# Altium footprint library IC.PcbLib: 386 footprints (part 3 of 30)
Each footprint in its own frame and in the unit in brackets; x right, y up, seen from the top. Pads: shape width x height; smd on the part's side, far side on the other; paste and mask are expansions set on the pad; w line width, h text height; cw(c..) or ccw(c..) is an arc to the next point about the centre after c.
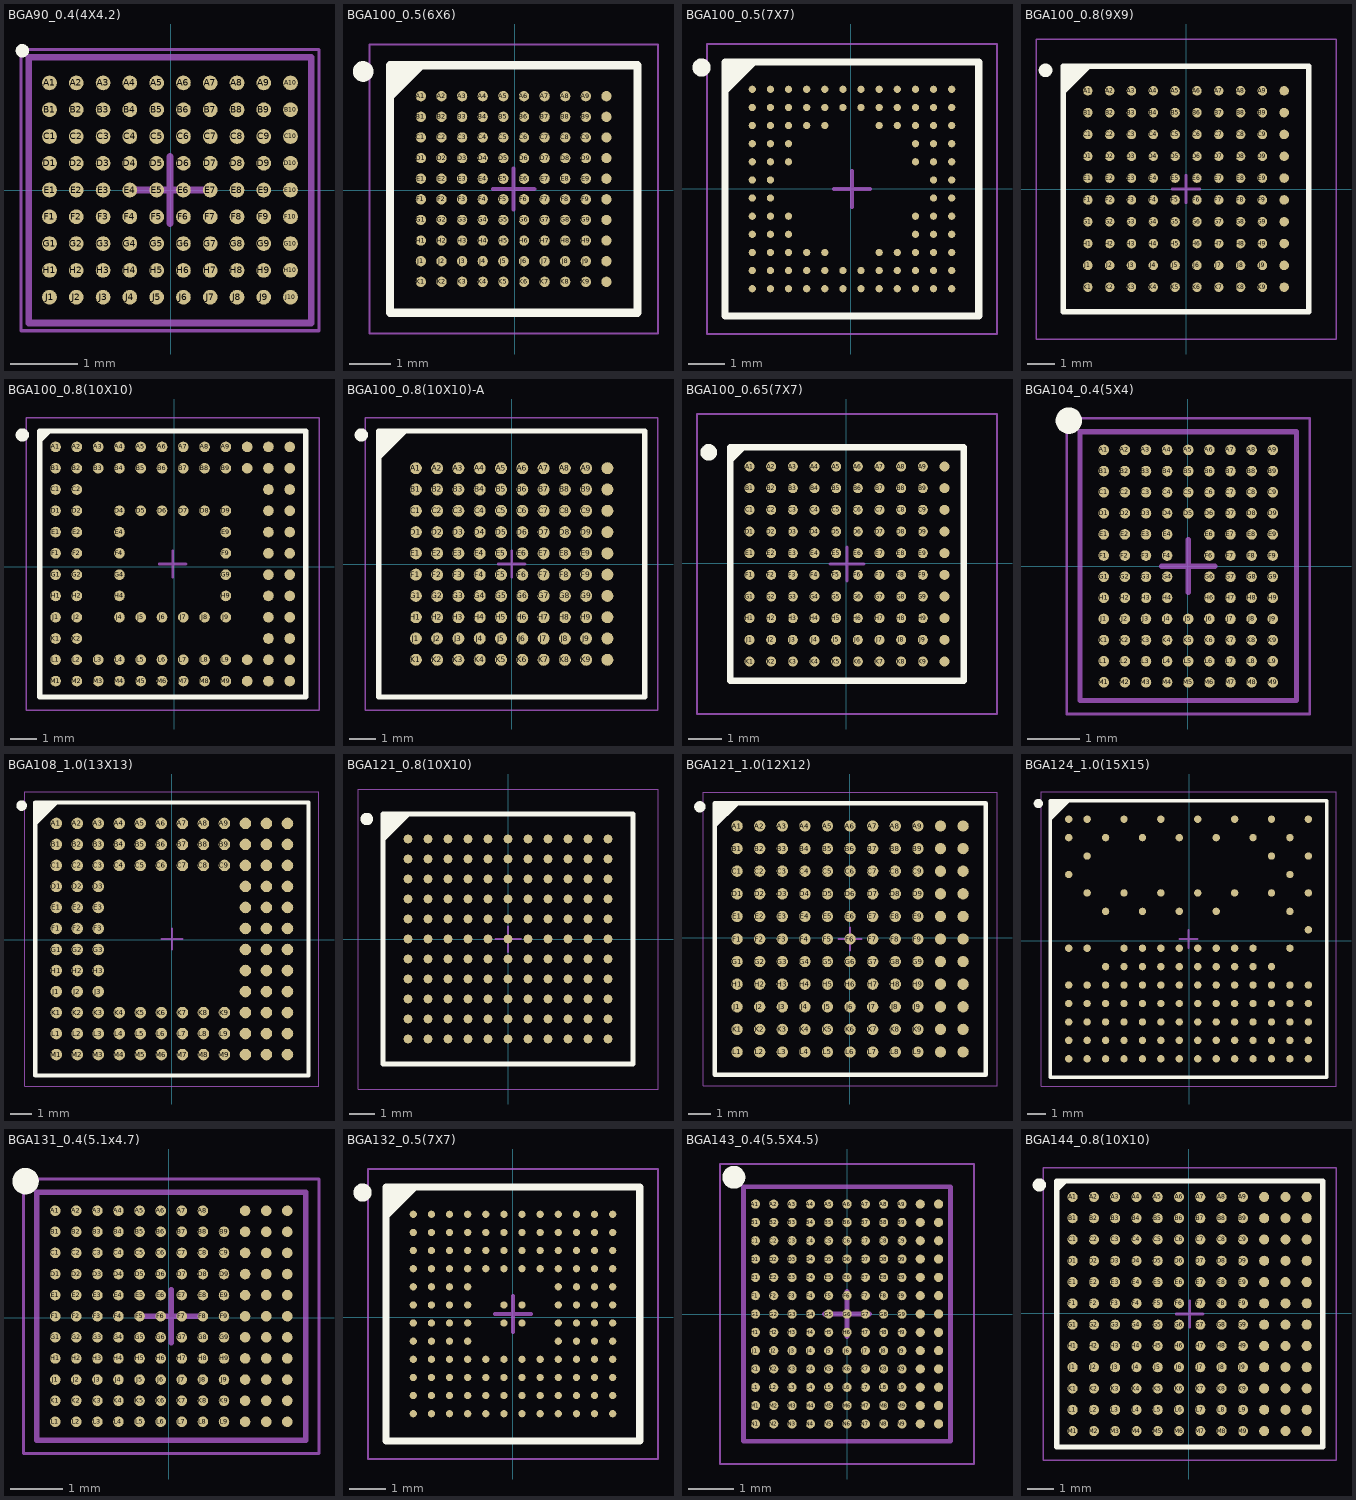
[diagram p2: the footprints below, top view; thin cyan lines are the x and y axes]

## BGA90_0.4(4X4.2) [mm]
pads (90):
  round 0.22 smd: A1(-1.813,1.6) A2(-1.413,1.6) A3(-1.013,1.6) A4(-0.613,1.6) A5(-0.213,1.6) A6(0.187,1.6) A7(0.587,1.6) A8(0.987,1.6) A9(1.387,1.6) A10(1.787,1.6) B1(-1.813,1.2) B2(-1.413,1.2) B3(-1.013,1.2) B4(-0.613,1.2) B5(-0.213,1.2) B6(0.187,1.2) B7(0.587,1.2) B8(0.987,1.2) B9(1.387,1.2) B10(1.787,1.2) C1(-1.813,0.8) C2(-1.413,0.8) C3(-1.013,0.8) C4(-0.613,0.8) C5(-0.213,0.8) C6(0.187,0.8) C7(0.587,0.8) C8(0.987,0.8) C9(1.387,0.8) C10(1.787,0.8) D1(-1.813,0.4) D2(-1.413,0.4) D3(-1.013,0.4) D4(-0.613,0.4) D5(-0.213,0.4) D6(0.187,0.4) D7(0.587,0.4) D8(0.987,0.4) D9(1.387,0.4) D10(1.787,0.4) E1(-1.813,0) E2(-1.413,0) E3(-1.013,0) E4(-0.613,0) E5(-0.213,0) E6(0.187,0) E7(0.587,0) E8(0.987,0) E9(1.387,0) E10(1.787,0) F1(-1.813,-0.4) F2(-1.413,-0.4) F3(-1.013,-0.4) F4(-0.613,-0.4) F5(-0.213,-0.4) F6(0.187,-0.4) F7(0.587,-0.4) F8(0.987,-0.4) F9(1.387,-0.4) F10(1.787,-0.4) G1(-1.813,-0.8) G2(-1.413,-0.8) G3(-1.013,-0.8) G4(-0.613,-0.8) G5(-0.213,-0.8) G6(0.187,-0.8) G7(0.587,-0.8) G8(0.987,-0.8) G9(1.387,-0.8) G10(1.787,-0.8) H1(-1.813,-1.2) H2(-1.413,-1.2) H3(-1.013,-1.2) H4(-0.613,-1.2) H5(-0.213,-1.2) H6(0.187,-1.2) H7(0.587,-1.2) H8(0.987,-1.2) H9(1.387,-1.2) H10(1.787,-1.2) J1(-1.813,-1.6) J2(-1.413,-1.6) J3(-1.013,-1.6) J4(-0.613,-1.6) J5(-0.213,-1.6) J6(0.187,-1.6) J7(0.587,-1.6) J8(0.987,-1.6) J9(1.387,-1.6) J10(1.787,-1.6)
Top Overlay:
  circle w0.1: c-2.219,2.081 r0.05
Mechanical 13:
  lines w0.1: -2.123,-1.985 -2.123,1.985 2.097,1.985 2.097,-1.985 -2.123,-1.985
Mechanical 15:
  lines w0.05: -2.238,-2.1 2.212,-2.1 2.212,2.1 -2.238,2.1 -2.238,-2.1
  lines w0.1: -0.513,0 0.487,0 ; -0.013,-0.5 -0.013,0.5
3D body "BGA90C40P10X9_420X400X65.step": height 0.65, standoff 0, extent -2.1,-2 2.1,2

## BGA100_0.5(6X6) [mm]
height 0.254
pads (100):
  round 0.25 smd: A1(-2.275,2.275) A2(-1.775,2.275) A3(-1.275,2.275) A4(-0.775,2.275) A5(-0.275,2.275) A6(0.225,2.275) A7(0.725,2.275) A8(1.225,2.275) A9(1.725,2.275) A10(2.225,2.275) B1(-2.275,1.775) B2(-1.775,1.775) B3(-1.275,1.775) B4(-0.775,1.775) B5(-0.275,1.775) B6(0.225,1.775) B7(0.725,1.775) B8(1.225,1.775) B9(1.725,1.775) B10(2.225,1.775) C1(-2.275,1.275) C2(-1.775,1.275) C3(-1.275,1.275) C4(-0.775,1.275) C5(-0.275,1.275) C6(0.225,1.275) C7(0.725,1.275) C8(1.225,1.275) C9(1.725,1.275) C10(2.225,1.275) D1(-2.275,0.775) D2(-1.775,0.775) D3(-1.275,0.775) D4(-0.775,0.775) D5(-0.275,0.775) D6(0.225,0.775) D7(0.725,0.775) D8(1.225,0.775) D9(1.725,0.775) D10(2.225,0.775) E1(-2.275,0.275) E2(-1.775,0.275) E3(-1.275,0.275) E4(-0.775,0.275) E5(-0.275,0.275) E6(0.225,0.275) E7(0.725,0.275) E8(1.225,0.275) E9(1.725,0.275) E10(2.225,0.275) F1(-2.275,-0.225) F2(-1.775,-0.225) F3(-1.275,-0.225) F4(-0.775,-0.225) F5(-0.275,-0.225) F6(0.225,-0.225) F7(0.725,-0.225) F8(1.225,-0.225) F9(1.725,-0.225) F10(2.225,-0.225) G1(-2.275,-0.725) G2(-1.775,-0.725) G3(-1.275,-0.725) G4(-0.775,-0.725) G5(-0.275,-0.725) G6(0.225,-0.725) G7(0.725,-0.725) G8(1.225,-0.725) G9(1.725,-0.725) G10(2.225,-0.725) H1(-2.275,-1.225) H2(-1.775,-1.225) H3(-1.275,-1.225) H4(-0.775,-1.225) H5(-0.275,-1.225) H6(0.225,-1.225) H7(0.725,-1.225) H8(1.225,-1.225) H9(1.725,-1.225) H10(2.225,-1.225) J1(-2.275,-1.725) J2(-1.775,-1.725) J3(-1.275,-1.725) J4(-0.775,-1.725) J5(-0.275,-1.725) J6(0.225,-1.725) J7(0.725,-1.725) J8(1.225,-1.725) J9(1.725,-1.725) J10(2.225,-1.725) K1(-2.275,-2.225) K2(-1.775,-2.225) K3(-1.275,-2.225) K4(-0.775,-2.225) K5(-0.275,-2.225) K6(0.225,-2.225) K7(0.725,-2.225) K8(1.225,-2.225) K9(1.725,-2.225) K10(2.225,-2.225)
Top Overlay:
  circle w0.25: c-3.675,2.875 r0.125
  region: -2.268,3.025 -3.025,2.268 -3.025,3.025
  lines w0.2: -3.025,2.268 -2.268,3.025 ; -3.025,-2.975 -3.025,3.025 2.975,3.025 2.975,-2.975 -3.025,-2.975
Mechanical 13:
  lines w0.1: -3.025,-2.975 -3.025,3.025 2.975,3.025 2.975,-2.975 -3.025,-2.975
Mechanical 15:
  lines w0.05: -3.525,-3.475 -3.525,3.525 3.475,3.525 3.475,-3.475 -3.525,-3.475
  lines w0.1: -0.525,0.025 0.475,0.025 ; -0.025,-0.475 -0.025,0.525
3D body "BGA100C50P10X10_600X600X65.step": height 0.65, standoff 0, extent -3.025,-2.949 2.975,3.051

## BGA100_0.5(7X7) [mm]
pads (100):
  round 0.2 smd: A1(-2.712,2.737) A2(-2.212,2.737) A3(-1.712,2.737) A4(-1.212,2.737) A5(-0.712,2.737) A6(-0.212,2.737) A7(0.288,2.737) A8(0.788,2.737) A9(1.288,2.737) A10(1.788,2.737) A11(2.288,2.737) A12(2.788,2.737) B1(-2.712,2.237) B2(-2.212,2.237) B3(-1.712,2.237) B4(-1.212,2.237) B5(-0.712,2.237) B6(-0.212,2.237) B7(0.288,2.237) B8(0.788,2.237) B9(1.288,2.237) B10(1.788,2.237) B11(2.288,2.237) B12(2.788,2.237) C1(-2.712,1.737) C2(-2.212,1.737) C3(-1.712,1.737) C4(-1.212,1.737) C5(-0.712,1.737) C8(0.788,1.737) C9(1.288,1.737) C10(1.788,1.737) C11(2.288,1.737) C12(2.788,1.737) D1(-2.712,1.237) D2(-2.212,1.237) D3(-1.712,1.237) D10(1.788,1.237) D11(2.288,1.237) D12(2.788,1.237) E1(-2.712,0.737) E2(-2.212,0.737) E3(-1.712,0.737) E10(1.788,0.737) E11(2.288,0.737) E12(2.788,0.737) F1(-2.712,0.237) F2(-2.212,0.237) F11(2.288,0.237) F12(2.788,0.237) G1(-2.712,-0.263) G2(-2.212,-0.263) G11(2.288,-0.263) G12(2.788,-0.263) H1(-2.712,-0.763) H2(-2.212,-0.763) H3(-1.712,-0.763) H10(1.788,-0.763) H11(2.288,-0.763) H12(2.788,-0.763) J1(-2.712,-1.263) J2(-2.212,-1.263) J3(-1.712,-1.263) J10(1.788,-1.263) J11(2.288,-1.263) J12(2.788,-1.263) K1(-2.712,-1.763) K2(-2.212,-1.763) K3(-1.712,-1.763) K4(-1.212,-1.763) K5(-0.712,-1.763) K8(0.788,-1.763) K9(1.288,-1.763) K10(1.788,-1.763) K11(2.288,-1.763) K12(2.788,-1.763) L1(-2.712,-2.263) L2(-2.212,-2.263) L3(-1.712,-2.263) L4(-1.212,-2.263) L5(-0.712,-2.263) L6(-0.212,-2.263) L7(0.288,-2.263) L8(0.788,-2.263) L9(1.288,-2.263) L10(1.788,-2.263) L11(2.288,-2.263) L12(2.788,-2.263) M1(-2.712,-2.763) M2(-2.212,-2.763) M3(-1.712,-2.763) M4(-1.212,-2.763) M5(-0.712,-2.763) M6(-0.212,-2.763) M7(0.288,-2.763) M8(0.788,-2.763) M9(1.288,-2.763) M10(1.788,-2.763) M11(2.288,-2.763) M12(2.788,-2.763)
Top Overlay:
  circle w0.25: c-4.112,3.337 r0.125
  region: -2.669,3.487 -3.462,2.694 -3.462,3.487
  lines w0.2: -3.462,2.694 -2.669,3.487 ; -3.462,-3.513 3.538,-3.513 3.538,3.487 -3.462,3.487 -3.462,-3.513
Mechanical 13:
  lines w0.1: -3.462,-3.513 3.538,-3.513 3.538,3.487 -3.462,3.487 -3.462,-3.513
Mechanical 15:
  lines w0.05: -3.962,-4.013 4.038,-4.013 4.038,3.987 -3.962,3.987 -3.962,-4.013
  lines w0.1: -0.462,-0.013 0.538,-0.013 ; 0.038,-0.513 0.038,0.487
3D body: height 0.6, standoff 0.05, extent -3.462,-3.513 3.538,3.487
3D body: height 0.61, standoff 0.18, extent -2.967,2.595 -2.568,2.994

## BGA100_0.8(9X9) [mm] "BGA, 100-Leads, Body 9x9mm, Pitch 0.8mm"
height 1.1
pads (100):
  round 0.35 smd: A1(-3.6,3.6) A2(-2.8,3.6) A3(-2,3.6) A4(-1.2,3.6) A5(-0.4,3.6) A6(0.4,3.6) A7(1.2,3.6) A8(2,3.6) A9(2.8,3.6) A10(3.6,3.6) B1(-3.6,2.8) B2(-2.8,2.8) B3(-2,2.8) B4(-1.2,2.8) B5(-0.4,2.8) B6(0.4,2.8) B7(1.2,2.8) B8(2,2.8) B9(2.8,2.8) B10(3.6,2.8) C1(-3.6,2) C2(-2.8,2) C3(-2,2) C4(-1.2,2) C5(-0.4,2) C6(0.4,2) C7(1.2,2) C8(2,2) C9(2.8,2) C10(3.6,2) D1(-3.6,1.2) D2(-2.8,1.2) D3(-2,1.2) D4(-1.2,1.2) D5(-0.4,1.2) D6(0.4,1.2) D7(1.2,1.2) D8(2,1.2) D9(2.8,1.2) D10(3.6,1.2) E1(-3.6,0.4) E2(-2.8,0.4) E3(-2,0.4) E4(-1.2,0.4) E5(-0.4,0.4) E6(0.4,0.4) E7(1.2,0.4) E8(2,0.4) E9(2.8,0.4) E10(3.6,0.4) F1(-3.6,-0.4) F2(-2.8,-0.4) F3(-2,-0.4) F4(-1.2,-0.4) F5(-0.4,-0.4) F6(0.4,-0.4) F7(1.2,-0.4) F8(2,-0.4) F9(2.8,-0.4) F10(3.6,-0.4) G1(-3.6,-1.2) G2(-2.8,-1.2) G3(-2,-1.2) G4(-1.2,-1.2) G5(-0.4,-1.2) G6(0.4,-1.2) G7(1.2,-1.2) G8(2,-1.2) G9(2.8,-1.2) G10(3.6,-1.2) H1(-3.6,-2) H2(-2.8,-2) H3(-2,-2) H4(-1.2,-2) H5(-0.4,-2) H6(0.4,-2) H7(1.2,-2) H8(2,-2) H9(2.8,-2) H10(3.6,-2) J1(-3.6,-2.8) J2(-2.8,-2.8) J3(-2,-2.8) J4(-1.2,-2.8) J5(-0.4,-2.8) J6(0.4,-2.8) J7(1.2,-2.8) J8(2,-2.8) J9(2.8,-2.8) J10(3.6,-2.8) K1(-3.6,-3.6) K2(-2.8,-3.6) K3(-2,-3.6) K4(-1.2,-3.6) K5(-0.4,-3.6) K6(0.4,-3.6) K7(1.2,-3.6) K8(2,-3.6) K9(2.8,-3.6) K10(3.6,-3.6)
Top Overlay:
  circle w0.25: c-5.15,4.35 r0.125
  region: -3.584,4.5 -4.5,3.584 -4.5,4.5
  lines w0.2: -4.5,3.584 -3.584,4.5 ; -4.5,-4.5 -4.5,4.5 4.5,4.5 4.5,-4.5 -4.5,-4.5
Mechanical 13:
  lines w0.1: -4.5,-4.5 -4.5,4.5 4.5,4.5 4.5,-4.5 -4.5,-4.5
Mechanical 15:
  lines w0.05: -5.5,-5.5 -5.5,5.5 5.5,5.5 5.5,-5.5 -5.5,-5.5
  lines w0.1: -0.5,0 0.5,0 ; 0,-0.5 0,0.5
3D body "User Library-TFBGA100.step": height 1.06, standoff 0, extent -4.5,-4.5 4.5,4.5

## BGA100_0.8(10X10) [mm]
pads (100):
  round 0.4 smd: A1(-4.451,4.502) A2(-3.651,4.502) A3(-2.851,4.502) A4(-2.051,4.502) A5(-1.251,4.502) A6(-0.451,4.502) A7(0.349,4.502) A8(1.149,4.502) A9(1.949,4.502) A10(2.749,4.502) A11(3.549,4.502) A12(4.349,4.502) B1(-4.451,3.702) B2(-3.651,3.702) B3(-2.851,3.702) B4(-2.051,3.702) B5(-1.251,3.702) B6(-0.451,3.702) B7(0.349,3.702) B8(1.149,3.702) B9(1.949,3.702) B10(2.749,3.702) B11(3.549,3.702) B12(4.349,3.702) C1(-4.451,2.902) C2(-3.651,2.902) C11(3.549,2.902) C12(4.349,2.902) D1(-4.451,2.102) D2(-3.651,2.102) D4(-2.051,2.102) D5(-1.251,2.102) D6(-0.451,2.102) D7(0.349,2.102) D8(1.149,2.102) D9(1.949,2.102) D11(3.549,2.102) D12(4.349,2.102) E1(-4.451,1.302) E2(-3.651,1.302) E4(-2.051,1.302) E9(1.949,1.302) E11(3.549,1.302) E12(4.349,1.302) F1(-4.451,0.502) F2(-3.651,0.502) F4(-2.051,0.502) F9(1.949,0.502) F11(3.549,0.502) F12(4.349,0.502) G1(-4.451,-0.298) G2(-3.651,-0.298) G4(-2.051,-0.298) G9(1.949,-0.298) G11(3.549,-0.298) G12(4.349,-0.298) H1(-4.451,-1.098) H2(-3.651,-1.098) H4(-2.051,-1.098) H9(1.949,-1.098) H11(3.549,-1.098) H12(4.349,-1.098) J1(-4.451,-1.898) J2(-3.651,-1.898) J4(-2.051,-1.898) J5(-1.251,-1.898) J6(-0.451,-1.898) J7(0.349,-1.898) J8(1.149,-1.898) J9(1.949,-1.898) J11(3.549,-1.898) J12(4.349,-1.898) K1(-4.451,-2.698) K2(-3.651,-2.698) K11(3.549,-2.698) K12(4.349,-2.698) L1(-4.451,-3.498) L2(-3.651,-3.498) L3(-2.851,-3.498) L4(-2.051,-3.498) L5(-1.251,-3.498) L6(-0.451,-3.498) L7(0.349,-3.498) L8(1.149,-3.498) L9(1.949,-3.498) L10(2.749,-3.498) L11(3.549,-3.498) L12(4.349,-3.498) M1(-4.451,-4.298) M2(-3.651,-4.298) M3(-2.851,-4.298) M4(-2.051,-4.298) M5(-1.251,-4.298) M6(-0.451,-4.298) M7(0.349,-4.298) M8(1.149,-4.298) M9(1.949,-4.298) M10(2.749,-4.298) M11(3.549,-4.298) M12(4.349,-4.298)
Top Overlay:
  circle w0.25: c-5.701,4.952 r0.125
  region: -4.699,5.102 -5.051,4.75 -5.051,5.102
  lines w0.2: -5.051,4.75 -4.699,5.102 ; -5.051,-4.898 -5.051,5.102 4.949,5.102 4.949,-4.898 -5.051,-4.898
Mechanical 13:
  lines w0.1: -5.051,-4.898 -5.051,5.102 4.949,5.102 4.949,-4.898 -5.051,-4.898
Mechanical 15:
  lines w0.05: -5.551,-5.398 -5.551,5.602 5.449,5.602 5.449,-5.398 -5.551,-5.398
  lines w0.1: -0.551,0.102 0.449,0.102 ; -0.051,-0.398 -0.051,0.602
3D body: height 1.4, standoff 0.29, extent -5.051,-4.898 4.949,5.102

## BGA100_0.8(10X10)-A [mm]
pads (100):
  round 0.45 smd: A1(-3.606,3.607) A2(-2.806,3.607) A3(-2.006,3.607) A4(-1.206,3.607) A5(-0.406,3.607) A6(0.394,3.607) A7(1.194,3.607) A8(1.994,3.607) A9(2.794,3.607) A10(3.594,3.607) B1(-3.606,2.807) B2(-2.806,2.807) B3(-2.006,2.807) B4(-1.206,2.807) B5(-0.406,2.807) B6(0.394,2.807) B7(1.194,2.807) B8(1.994,2.807) B9(2.794,2.807) B10(3.594,2.807) C1(-3.606,2.007) C2(-2.806,2.007) C3(-2.006,2.007) C4(-1.206,2.007) C5(-0.406,2.007) C6(0.394,2.007) C7(1.194,2.007) C8(1.994,2.007) C9(2.794,2.007) C10(3.594,2.007) D1(-3.606,1.207) D2(-2.806,1.207) D3(-2.006,1.207) D4(-1.206,1.207) D5(-0.406,1.207) D6(0.394,1.207) D7(1.194,1.207) D8(1.994,1.207) D9(2.794,1.207) D10(3.594,1.207) E1(-3.606,0.407) E2(-2.806,0.407) E3(-2.006,0.407) E4(-1.206,0.407) E5(-0.406,0.407) E6(0.394,0.407) E7(1.194,0.407) E8(1.994,0.407) E9(2.794,0.407) E10(3.594,0.407) F1(-3.606,-0.393) F2(-2.806,-0.393) F3(-2.006,-0.393) F4(-1.206,-0.393) F5(-0.406,-0.393) F6(0.394,-0.393) F7(1.194,-0.393) F8(1.994,-0.393) F9(2.794,-0.393) F10(3.594,-0.393) G1(-3.606,-1.193) G2(-2.806,-1.193) G3(-2.006,-1.193) G4(-1.206,-1.193) G5(-0.406,-1.193) G6(0.394,-1.193) G7(1.194,-1.193) G8(1.994,-1.193) G9(2.794,-1.193) G10(3.594,-1.193) H1(-3.606,-1.993) H2(-2.806,-1.993) H3(-2.006,-1.993) H4(-1.206,-1.993) H5(-0.406,-1.993) H6(0.394,-1.993) H7(1.194,-1.993) H8(1.994,-1.993) H9(2.794,-1.993) H10(3.594,-1.993) J1(-3.606,-2.793) J2(-2.806,-2.793) J3(-2.006,-2.793) J4(-1.206,-2.793) J5(-0.406,-2.793) J6(0.394,-2.793) J7(1.194,-2.793) J8(1.994,-2.793) J9(2.794,-2.793) J10(3.594,-2.793) K1(-3.606,-3.593) K2(-2.806,-3.593) K3(-2.006,-3.593) K4(-1.206,-3.593) K5(-0.406,-3.593) K6(0.394,-3.593) K7(1.194,-3.593) K8(1.994,-3.593) K9(2.794,-3.593) K10(3.594,-3.593)
Top Overlay:
  circle w0.25: c-5.656,4.857 r0.125
  region: -4.006,5.007 -5.006,4.007 -5.006,5.007
  lines w0.2: -5.006,4.007 -4.006,5.007 ; -5.006,-4.993 -5.006,5.007 4.994,5.007 4.994,-4.993 -5.006,-4.993
Mechanical 13:
  lines w0.1: -5.006,-4.993 -5.006,5.007 4.994,5.007 4.994,-4.993 -5.006,-4.993
Mechanical 15:
  lines w0.05: -5.506,-5.493 -5.506,5.507 5.494,5.507 5.494,-5.493 -5.506,-5.493
  lines w0.1: -0.506,0.007 0.494,0.007 ; -0.006,-0.493 -0.006,0.507
3D body "User Library-A3D-009-00025.step": height 2.08, standoff -0.02, extent -4.978,-5 5.022,5

## BGA100_0.65(7X7) [mm]
pads (100):
  round 0.3 smd: A1(-2.9,2.9) A2(-2.25,2.9) A3(-1.6,2.9) A4(-0.95,2.9) A5(-0.3,2.9) A6(0.35,2.9) A7(1,2.9) A8(1.65,2.9) A9(2.3,2.9) A10(2.95,2.9) B1(-2.9,2.25) B2(-2.25,2.25) B3(-1.6,2.25) B4(-0.95,2.25) B5(-0.3,2.25) B6(0.35,2.25) B7(1,2.25) B8(1.65,2.25) B9(2.3,2.25) B10(2.95,2.25) C1(-2.9,1.6) C2(-2.25,1.6) C3(-1.6,1.6) C4(-0.95,1.6) C5(-0.3,1.6) C6(0.35,1.6) C7(1,1.6) C8(1.65,1.6) C9(2.3,1.6) C10(2.95,1.6) D1(-2.9,0.95) D2(-2.25,0.95) D3(-1.6,0.95) D4(-0.95,0.95) D5(-0.3,0.95) D6(0.35,0.95) D7(1,0.95) D8(1.65,0.95) D9(2.3,0.95) D10(2.95,0.95) E1(-2.9,0.3) E2(-2.25,0.3) E3(-1.6,0.3) E4(-0.95,0.3) E5(-0.3,0.3) E6(0.35,0.3) E7(1,0.3) E8(1.65,0.3) E9(2.3,0.3) E10(2.95,0.3) F1(-2.9,-0.35) F2(-2.25,-0.35) F3(-1.6,-0.35) F4(-0.95,-0.35) F5(-0.3,-0.35) F6(0.35,-0.35) F7(1,-0.35) F8(1.65,-0.35) F9(2.3,-0.35) F10(2.95,-0.35) G1(-2.9,-1) G2(-2.25,-1) G3(-1.6,-1) G4(-0.95,-1) G5(-0.3,-1) G6(0.35,-1) G7(1,-1) G8(1.65,-1) G9(2.3,-1) G10(2.95,-1) H1(-2.9,-1.65) H2(-2.25,-1.65) H3(-1.6,-1.65) H4(-0.95,-1.65) H5(-0.3,-1.65) H6(0.35,-1.65) H7(1,-1.65) H8(1.65,-1.65) H9(2.3,-1.65) H10(2.95,-1.65) J1(-2.9,-2.3) J2(-2.25,-2.3) J3(-1.6,-2.3) J4(-0.95,-2.3) J5(-0.3,-2.3) J6(0.35,-2.3) J7(1,-2.3) J8(1.65,-2.3) J9(2.3,-2.3) J10(2.95,-2.3) K1(-2.9,-2.95) K2(-2.25,-2.95) K3(-1.6,-2.95) K4(-0.95,-2.95) K5(-0.3,-2.95) K6(0.35,-2.95) K7(1,-2.95) K8(1.65,-2.95) K9(2.3,-2.95) K10(2.95,-2.95)
Top Overlay:
  circle w0.25: c-4.125,3.325 r0.125
  region: -3.102,3.475 -3.475,3.102 -3.475,3.475
  lines w0.2: -3.475,3.102 -3.102,3.475 ; -3.475,-3.525 3.525,-3.525 3.525,3.475 -3.475,3.475 -3.475,-3.525
Mechanical 13:
  lines w0.1: -3.475,-3.525 3.525,-3.525 3.525,3.475 -3.475,3.475 -3.475,-3.525
Mechanical 15:
  lines w0.05: -4.475,-4.525 4.525,-4.525 4.525,4.475 -4.475,4.475 -4.475,-4.525
  lines w0.1: -0.475,-0.025 0.525,-0.025 ; 0.025,-0.525 0.025,0.475
3D body "BGA100C65P10X10_700X700X100.step": height 1, standoff 0, extent -3.475,-3.5 3.525,3.5

## BGA104_0.4(5X4) [mm]
pads (104):
  round 0.2 smd: A1(-1.587,2.2) A2(-1.187,2.2) A3(-0.787,2.2) A4(-0.387,2.2) A5(0.013,2.2) A6(0.413,2.2) A7(0.813,2.2) A8(1.213,2.2) A9(1.613,2.2) B1(-1.587,1.8) B2(-1.187,1.8) B3(-0.787,1.8) B4(-0.387,1.8) B5(0.013,1.8) B6(0.413,1.8) B7(0.813,1.8) B8(1.213,1.8) B9(1.613,1.8) C1(-1.587,1.4) C2(-1.187,1.4) C3(-0.787,1.4) C4(-0.387,1.4) C5(0.013,1.4) C6(0.413,1.4) C7(0.813,1.4) C8(1.213,1.4) C9(1.613,1.4) D1(-1.587,1) D2(-1.187,1) D3(-0.787,1) D4(-0.387,1) D5(0.013,1) D6(0.413,1) D7(0.813,1) D8(1.213,1) D9(1.613,1) E1(-1.587,0.6) E2(-1.187,0.6) E3(-0.787,0.6) E4(-0.387,0.6) E6(0.413,0.6) E7(0.813,0.6) E8(1.213,0.6) E9(1.613,0.6) F1(-1.587,0.2) F2(-1.187,0.2) F3(-0.787,0.2) F4(-0.387,0.2) F6(0.413,0.2) F7(0.813,0.2) F8(1.213,0.2) F9(1.613,0.2) G1(-1.587,-0.2) G2(-1.187,-0.2) G3(-0.787,-0.2) G4(-0.387,-0.2) G6(0.413,-0.2) G7(0.813,-0.2) G8(1.213,-0.2) G9(1.613,-0.2) H1(-1.587,-0.6) H2(-1.187,-0.6) H3(-0.787,-0.6) H4(-0.387,-0.6) H6(0.413,-0.6) H7(0.813,-0.6) H8(1.213,-0.6) H9(1.613,-0.6) J1(-1.587,-1) J2(-1.187,-1) J3(-0.787,-1) J4(-0.387,-1) J5(0.013,-1) J6(0.413,-1) J7(0.813,-1) J8(1.213,-1) J9(1.613,-1) K1(-1.587,-1.4) K2(-1.187,-1.4) K3(-0.787,-1.4) K4(-0.387,-1.4) K5(0.013,-1.4) K6(0.413,-1.4) K7(0.813,-1.4) K8(1.213,-1.4) K9(1.613,-1.4) L1(-1.587,-1.8) L2(-1.187,-1.8) L3(-0.787,-1.8) L4(-0.387,-1.8) L5(0.013,-1.8) L6(0.413,-1.8) L7(0.813,-1.8) L8(1.213,-1.8) L9(1.613,-1.8) M1(-1.587,-2.2) M2(-1.187,-2.2) M3(-0.787,-2.2) M4(-0.387,-2.2) M5(0.013,-2.2) M6(0.413,-2.2) M7(0.813,-2.2) M8(1.213,-2.2) M9(1.613,-2.2)
Top Overlay:
  circle w0.25: c-2.247,2.755 r0.125
Mechanical 13:
  lines w0.1: -2.037,-2.545 -2.037,2.545 2.063,2.545 2.063,-2.545 -2.037,-2.545
Mechanical 15:
  lines w0.05: -2.287,-2.8 -2.287,2.8 2.313,2.8 2.313,-2.8 -2.287,-2.8
  lines w0.1: -0.487,0 0.513,0 ; 0.013,-0.5 0.013,0.5
3D body "User Library-WLCSP104.step": height 0.56, standoff 0, extent -2.065,-2.564 2.065,2.564

## BGA108_1.0(13X13) [mm]
pads (108):
  round 0.55 smd: A1(-5.5,5.525) A2(-4.5,5.525) A3(-3.5,5.525) A4(-2.5,5.525) A5(-1.5,5.525) A6(-0.5,5.525) A7(0.5,5.525) A8(1.5,5.525) A9(2.5,5.525) A10(3.5,5.525) A11(4.5,5.525) A12(5.5,5.525) B1(-5.5,4.525) B2(-4.5,4.525) B3(-3.5,4.525) B4(-2.5,4.525) B5(-1.5,4.525) B6(-0.5,4.525) B7(0.5,4.525) B8(1.5,4.525) B9(2.5,4.525) B10(3.5,4.525) B11(4.5,4.525) B12(5.5,4.525) C1(-5.5,3.525) C2(-4.5,3.525) C3(-3.5,3.525) C4(-2.5,3.525) C5(-1.5,3.525) C6(-0.5,3.525) C7(0.5,3.525) C8(1.5,3.525) C9(2.5,3.525) C10(3.5,3.525) C11(4.5,3.525) C12(5.5,3.525) D1(-5.5,2.525) D2(-4.5,2.525) D3(-3.5,2.525) D10(3.5,2.525) D11(4.5,2.525) D12(5.5,2.525) E1(-5.5,1.525) E2(-4.5,1.525) E3(-3.5,1.525) E10(3.5,1.525) E11(4.5,1.525) E12(5.5,1.525) F1(-5.5,0.525) F2(-4.5,0.525) F3(-3.5,0.525) F10(3.5,0.525) F11(4.5,0.525) F12(5.5,0.525) G1(-5.5,-0.475) G2(-4.5,-0.475) G3(-3.5,-0.475) G10(3.5,-0.475) G11(4.5,-0.475) G12(5.5,-0.475) H1(-5.5,-1.475) H2(-4.5,-1.475) H3(-3.5,-1.475) H10(3.5,-1.475) H11(4.5,-1.475) H12(5.5,-1.475) J1(-5.5,-2.475) J2(-4.5,-2.475) J3(-3.5,-2.475) J10(3.5,-2.475) J11(4.5,-2.475) J12(5.5,-2.475) K1(-5.5,-3.475) K2(-4.5,-3.475) K3(-3.5,-3.475) K4(-2.5,-3.475) K5(-1.5,-3.475) K6(-0.5,-3.475) K7(0.5,-3.475) K8(1.5,-3.475) K9(2.5,-3.475) K10(3.5,-3.475) K11(4.5,-3.475) K12(5.5,-3.475) L1(-5.5,-4.475) L2(-4.5,-4.475) L3(-3.5,-4.475) L4(-2.5,-4.475) L5(-1.5,-4.475) L6(-0.5,-4.475) L7(0.5,-4.475) L8(1.5,-4.475) L9(2.5,-4.475) L10(3.5,-4.475) L11(4.5,-4.475) L12(5.5,-4.475) M1(-5.5,-5.475) M2(-4.5,-5.475) M3(-3.5,-5.475) M4(-2.5,-5.475) M5(-1.5,-5.475) M6(-0.5,-5.475) M7(0.5,-5.475) M8(1.5,-5.475) M9(2.5,-5.475) M10(3.5,-5.475) M11(4.5,-5.475) M12(5.5,-5.475)
Top Overlay:
  circle w0.25: c-7.15,6.375 r0.125
  region: -5.5,6.525 -6.5,5.525 -6.5,6.525
  lines w0.2: -6.5,5.525 -5.5,6.525 ; -6.5,-6.475 -6.5,6.525 6.5,6.525 6.5,-6.475 -6.5,-6.475
Mechanical 13:
  lines w0.1: -6.5,-6.475 -6.5,6.525 6.5,6.525 6.5,-6.475 -6.5,-6.475
Mechanical 15:
  lines w0.05: -7,-6.975 -7,7.025 7,7.025 7,-6.975 -7,-6.975
  lines w0.1: -0.5,0.025 0.5,0.025 ; 0,-0.475 0,0.525
3D body: height 1.85, standoff 0.65, extent -6.5,-6.475 6.5,6.525

## BGA121_0.8(10X10) [mm] "BGA, 121-Leads, Body 10x10mm, Pitch 0.8mm"
height 1.2
pads (121):
  round 0.35 smd: A1(-4,4) A2(-3.2,4) A3(-2.4,4) A4(-1.6,4) A5(-0.8,4) A6(0,4) A7(0.8,4) A8(1.6,4) A9(2.4,4) A10(3.2,4) A11(4,4) B1(-4,3.2) B2(-3.2,3.2) B3(-2.4,3.2) B4(-1.6,3.2) B5(-0.8,3.2) B6(0,3.2) B7(0.8,3.2) B8(1.6,3.2) B9(2.4,3.2) B10(3.2,3.2) B11(4,3.2) C1(-4,2.4) C2(-3.2,2.4) C3(-2.4,2.4) C4(-1.6,2.4) C5(-0.8,2.4) C6(0,2.4) C7(0.8,2.4) C8(1.6,2.4) C9(2.4,2.4) C10(3.2,2.4) C11(4,2.4) D1(-4,1.6) D2(-3.2,1.6) D3(-2.4,1.6) D4(-1.6,1.6) D5(-0.8,1.6) D6(0,1.6) D7(0.8,1.6) D8(1.6,1.6) D9(2.4,1.6) D10(3.2,1.6) D11(4,1.6) E1(-4,0.8) E2(-3.2,0.8) E3(-2.4,0.8) E4(-1.6,0.8) E5(-0.8,0.8) E6(0,0.8) E7(0.8,0.8) E8(1.6,0.8) E9(2.4,0.8) E10(3.2,0.8) E11(4,0.8) F1(-4,0) F2(-3.2,0) F3(-2.4,0) F4(-1.6,0) F5(-0.8,0) F6(0,0) F7(0.8,0) F8(1.6,0) F9(2.4,0) F10(3.2,0) F11(4,0) G1(-4,-0.8) G2(-3.2,-0.8) G3(-2.4,-0.8) G4(-1.6,-0.8) G5(-0.8,-0.8) G6(0,-0.8) G7(0.8,-0.8) G8(1.6,-0.8) G9(2.4,-0.8) G10(3.2,-0.8) G11(4,-0.8) H1(-4,-1.6) H2(-3.2,-1.6) H3(-2.4,-1.6) H4(-1.6,-1.6) H5(-0.8,-1.6) H6(0,-1.6) H7(0.8,-1.6) H8(1.6,-1.6) H9(2.4,-1.6) H10(3.2,-1.6) H11(4,-1.6) J1(-4,-2.4) J2(-3.2,-2.4) J3(-2.4,-2.4) J4(-1.6,-2.4) J5(-0.8,-2.4) J6(0,-2.4) J7(0.8,-2.4) J8(1.6,-2.4) J9(2.4,-2.4) J10(3.2,-2.4) J11(4,-2.4) K1(-4,-3.2) K2(-3.2,-3.2) K3(-2.4,-3.2) K4(-1.6,-3.2) K5(-0.8,-3.2) K6(0,-3.2) K7(0.8,-3.2) K8(1.6,-3.2) K9(2.4,-3.2) K10(3.2,-3.2) K11(4,-3.2) L1(-4,-4) L2(-3.2,-4) L3(-2.4,-4) L4(-1.6,-4) L5(-0.8,-4) L6(0,-4) L7(0.8,-4) L8(1.6,-4) L9(2.4,-4) L10(3.2,-4) L11(4,-4)
Top Overlay:
  circle w0.25: c-5.65,4.8 r0.125
  region: -4,5 -5,4 -5,5
  lines w0.2: -5,4 -4,5 ; -5,-5 5,-5 5,5 -5,5 -5,-5
Mechanical 13:
  lines w0.1: -5,-5 5,-5 5,5 -5,5 -5,-5
Mechanical 15:
  lines w0.05: -6,-6 6,-6 6,6 -6,6 -6,-6
  lines w0.1: -0.5,0 0.5,0 ; 0,-0.5 0,0.5
3D body "User Library-BGA-121_10x10.step": height 1.11, standoff 0, extent -4.974,-4.975 5.026,5.025

## BGA121_1.0(12X12) [mm]
pads (121):
  round 0.5 smd: A1(-4.975,4.949) A2(-3.975,4.949) A3(-2.975,4.949) A4(-1.975,4.949) A5(-0.975,4.949) A6(0.025,4.949) A7(1.025,4.949) A8(2.025,4.949) A9(3.025,4.949) A10(4.025,4.949) A11(5.025,4.949) B1(-4.975,3.949) B2(-3.975,3.949) B3(-2.975,3.949) B4(-1.975,3.949) B5(-0.975,3.949) B6(0.025,3.949) B7(1.025,3.949) B8(2.025,3.949) B9(3.025,3.949) B10(4.025,3.949) B11(5.025,3.949) C1(-4.975,2.949) C2(-3.975,2.949) C3(-2.975,2.949) C4(-1.975,2.949) C5(-0.975,2.949) C6(0.025,2.949) C7(1.025,2.949) C8(2.025,2.949) C9(3.025,2.949) C10(4.025,2.949) C11(5.025,2.949) D1(-4.975,1.949) D2(-3.975,1.949) D3(-2.975,1.949) D4(-1.975,1.949) D5(-0.975,1.949) D6(0.025,1.949) D7(1.025,1.949) D8(2.025,1.949) D9(3.025,1.949) D10(4.025,1.949) D11(5.025,1.949) E1(-4.975,0.949) E2(-3.975,0.949) E3(-2.975,0.949) E4(-1.975,0.949) E5(-0.975,0.949) E6(0.025,0.949) E7(1.025,0.949) E8(2.025,0.949) E9(3.025,0.949) E10(4.025,0.949) E11(5.025,0.949) F1(-4.975,-0.051) F2(-3.975,-0.051) F3(-2.975,-0.051) F4(-1.975,-0.051) F5(-0.975,-0.051) F6(0.025,-0.051) F7(1.025,-0.051) F8(2.025,-0.051) F9(3.025,-0.051) F10(4.025,-0.051) F11(5.025,-0.051) G1(-4.975,-1.051) G2(-3.975,-1.051) G3(-2.975,-1.051) G4(-1.975,-1.051) G5(-0.975,-1.051) G6(0.025,-1.051) G7(1.025,-1.051) G8(2.025,-1.051) G9(3.025,-1.051) G10(4.025,-1.051) G11(5.025,-1.051) H1(-4.975,-2.051) H2(-3.975,-2.051) H3(-2.975,-2.051) H4(-1.975,-2.051) H5(-0.975,-2.051) H6(0.025,-2.051) H7(1.025,-2.051) H8(2.025,-2.051) H9(3.025,-2.051) H10(4.025,-2.051) H11(5.025,-2.051) J1(-4.975,-3.051) J2(-3.975,-3.051) J3(-2.975,-3.051) J4(-1.975,-3.051) J5(-0.975,-3.051) J6(0.025,-3.051) J7(1.025,-3.051) J8(2.025,-3.051) J9(3.025,-3.051) J10(4.025,-3.051) J11(5.025,-3.051) K1(-4.975,-4.051) K2(-3.975,-4.051) K3(-2.975,-4.051) K4(-1.975,-4.051) K5(-0.975,-4.051) K6(0.025,-4.051) K7(1.025,-4.051) K8(2.025,-4.051) K9(3.025,-4.051) K10(4.025,-4.051) K11(5.025,-4.051) L1(-4.975,-5.051) L2(-3.975,-5.051) L3(-2.975,-5.051) L4(-1.975,-5.051) L5(-0.975,-5.051) L6(0.025,-5.051) L7(1.025,-5.051) L8(2.025,-5.051) L9(3.025,-5.051) L10(4.025,-5.051) L11(5.025,-5.051)
Top Overlay:
  circle w0.25: c-6.625,5.799 r0.125
  region: -4.975,5.949 -5.975,4.949 -5.975,5.949
  lines w0.2: -5.975,4.949 -4.975,5.949 ; -5.975,-6.051 -5.975,5.949 6.025,5.949 6.025,-6.051 -5.975,-6.051
Mechanical 13:
  lines w0.1: -5.975,-6.051 -5.975,5.949 6.025,5.949 6.025,-6.051 -5.975,-6.051
Mechanical 15:
  lines w0.05: -6.475,-6.551 6.525,-6.551 6.525,6.449 -6.475,6.449 -6.475,-6.551
  lines w0.1: -0.475,-0.051 0.525,-0.051 ; 0.025,-0.551 0.025,0.449
3D body "User Library-User Library-BGA-121_12x12.step": height 1.11, standoff 0, extent -5.975,-6.051 6.025,5.949

## BGA124_1.0(15X15) [mm]
pads (124):
  round 0.4 smd: A1(-6.551,6.602) A2(-5.551,6.602) A4(-3.551,6.602) A6(-1.551,6.602) A8(0.449,6.602) A10(2.449,6.602) A12(4.449,6.602) A14(6.449,6.602) B1(-6.551,5.602) B3(-4.551,5.602) B5(-2.551,5.602) B7(-0.551,5.602) B9(1.449,5.602) B11(3.449,5.602) B13(5.449,5.602) C2(-5.551,4.602) C12(4.449,4.602) C14(6.449,4.602) D1(-6.551,3.602) D13(5.449,3.602) E2(-5.551,2.602) E4(-3.551,2.602) E6(-1.551,2.602) E8(0.449,2.602) E10(2.449,2.602) E12(4.449,2.602) E14(6.449,2.602) F3(-4.551,1.602) F5(-2.551,1.602) F7(-0.551,1.602) F9(1.449,1.602) F13(5.449,1.602) G14(6.449,0.602) H1(-6.551,-0.398) H2(-5.551,-0.398) H4(-3.551,-0.398) H5(-2.551,-0.398) H6(-1.551,-0.398) H7(-0.551,-0.398) H8(0.449,-0.398) H9(1.449,-0.398) H10(2.449,-0.398) H11(3.449,-0.398) H13(5.449,-0.398) J3(-4.551,-1.398) J4(-3.551,-1.398) J5(-2.551,-1.398) J6(-1.551,-1.398) J7(-0.551,-1.398) J8(0.449,-1.398) J9(1.449,-1.398) J10(2.449,-1.398) J11(3.449,-1.398) J12(4.449,-1.398) K1(-6.551,-2.398) K2(-5.551,-2.398) K3(-4.551,-2.398) K4(-3.551,-2.398) K5(-2.551,-2.398) K6(-1.551,-2.398) K7(-0.551,-2.398) K8(0.449,-2.398) K9(1.449,-2.398) K10(2.449,-2.398) K11(3.449,-2.398) K12(4.449,-2.398) K13(5.449,-2.398) K14(6.449,-2.398) L1(-6.551,-3.398) L2(-5.551,-3.398) L3(-4.551,-3.398) L4(-3.551,-3.398) L5(-2.551,-3.398) L6(-1.551,-3.398) L7(-0.551,-3.398) L8(0.449,-3.398) L9(1.449,-3.398) L10(2.449,-3.398) L11(3.449,-3.398) L12(4.449,-3.398) L13(5.449,-3.398) L14(6.449,-3.398) M1(-6.551,-4.398) M2(-5.551,-4.398) M3(-4.551,-4.398) M4(-3.551,-4.398) M5(-2.551,-4.398) M6(-1.551,-4.398) M7(-0.551,-4.398) M8(0.449,-4.398) M9(1.449,-4.398) M10(2.449,-4.398) M11(3.449,-4.398) M12(4.449,-4.398) M13(5.449,-4.398) M14(6.449,-4.398) N1(-6.551,-5.398) N2(-5.551,-5.398) N3(-4.551,-5.398) N4(-3.551,-5.398) N5(-2.551,-5.398) N6(-1.551,-5.398) N7(-0.551,-5.398) N8(0.449,-5.398) N9(1.449,-5.398) N10(2.449,-5.398) N11(3.449,-5.398) N12(4.449,-5.398) N13(5.449,-5.398) N14(6.449,-5.398) P1(-6.551,-6.398) P2(-5.551,-6.398) P3(-4.551,-6.398) P4(-3.551,-6.398) P5(-2.551,-6.398) P6(-1.551,-6.398) P7(-0.551,-6.398) P8(0.449,-6.398) P9(1.449,-6.398) P10(2.449,-6.398) P11(3.449,-6.398) P12(4.449,-6.398) P13(5.449,-6.398) P14(6.449,-6.398)
Top Overlay:
  circle w0.25: c-8.201,7.452 r0.125
  region: -6.551,7.602 -7.551,6.602 -7.551,7.602
  lines w0.2: -7.551,6.602 -6.551,7.602 ; -7.551,-7.398 7.449,-7.398 7.449,7.602 -7.551,7.602 -7.551,-7.398
Mechanical 13:
  lines w0.1: -7.551,-7.398 7.449,-7.398 7.449,7.602 -7.551,7.602 -7.551,-7.398
Mechanical 15:
  lines w0.05: -8.051,-7.898 7.949,-7.898 7.949,8.102 -8.051,8.102 -8.051,-7.898
  lines w0.1: -0.551,0.102 0.449,0.102 ; -0.051,-0.398 -0.051,0.602
3D body: height 1.7, standoff 0.31, extent -7.551,-7.398 7.449,7.602

## BGA131_0.4(5.1x4.7) [mm]
height 0.254
pads (131):
  round 0.2 smd: A1(-2.149,2.025) A2(-1.749,2.025) A3(-1.349,2.025) A4(-0.949,2.025) A5(-0.549,2.025) A6(-0.149,2.025) A7(0.251,2.025) A8(0.651,2.025) A10(1.451,2.025) A11(1.851,2.025) A12(2.251,2.025) B1(-2.149,1.625) B2(-1.749,1.625) B3(-1.349,1.625) B4(-0.949,1.625) B5(-0.549,1.625) B6(-0.149,1.625) B7(0.251,1.625) B8(0.651,1.625) B9(1.051,1.625) B10(1.451,1.625) B11(1.851,1.625) B12(2.251,1.625) C1(-2.149,1.225) C2(-1.749,1.225) C3(-1.349,1.225) C4(-0.949,1.225) C5(-0.549,1.225) C6(-0.149,1.225) C7(0.251,1.225) C8(0.651,1.225) C9(1.051,1.225) C10(1.451,1.225) C11(1.851,1.225) C12(2.251,1.225) D1(-2.149,0.825) D2(-1.749,0.825) D3(-1.349,0.825) D4(-0.949,0.825) D5(-0.549,0.825) D6(-0.149,0.825) D7(0.251,0.825) D8(0.651,0.825) D9(1.051,0.825) D10(1.451,0.825) D11(1.851,0.825) D12(2.251,0.825) E1(-2.149,0.425) E2(-1.749,0.425) E3(-1.349,0.425) E4(-0.949,0.425) E5(-0.549,0.425) E6(-0.149,0.425) E7(0.251,0.425) E8(0.651,0.425) E9(1.051,0.425) E10(1.451,0.425) E11(1.851,0.425) E12(2.251,0.425) F1(-2.149,0.025) F2(-1.749,0.025) F3(-1.349,0.025) F4(-0.949,0.025) F5(-0.549,0.025) F6(-0.149,0.025) F7(0.251,0.025) F8(0.651,0.025) F9(1.051,0.025) F10(1.451,0.025) F11(1.851,0.025) F12(2.251,0.025) G1(-2.149,-0.375) G2(-1.749,-0.375) G3(-1.349,-0.375) G4(-0.949,-0.375) G5(-0.549,-0.375) G6(-0.149,-0.375) G7(0.251,-0.375) G8(0.651,-0.375) G9(1.051,-0.375) G10(1.451,-0.375) G11(1.851,-0.375) G12(2.251,-0.375) H1(-2.149,-0.775) H2(-1.749,-0.775) H3(-1.349,-0.775) H4(-0.949,-0.775) H5(-0.549,-0.775) H6(-0.149,-0.775) H7(0.251,-0.775) H8(0.651,-0.775) H9(1.051,-0.775) H10(1.451,-0.775) H11(1.851,-0.775) H12(2.251,-0.775) J1(-2.149,-1.175) J2(-1.749,-1.175) J3(-1.349,-1.175) J4(-0.949,-1.175) J5(-0.549,-1.175) J6(-0.149,-1.175) J7(0.251,-1.175) J8(0.651,-1.175) J9(1.051,-1.175) J10(1.451,-1.175) J11(1.851,-1.175) J12(2.251,-1.175) K1(-2.149,-1.575) K2(-1.749,-1.575) K3(-1.349,-1.575) K4(-0.949,-1.575) K5(-0.549,-1.575) K6(-0.149,-1.575) K7(0.251,-1.575) K8(0.651,-1.575) K9(1.051,-1.575) K10(1.451,-1.575) K11(1.851,-1.575) K12(2.251,-1.575) L1(-2.149,-1.975) L2(-1.749,-1.975) L3(-1.349,-1.975) L4(-0.949,-1.975) L5(-0.549,-1.975) L6(-0.149,-1.975) L7(0.251,-1.975) L8(0.651,-1.975) L9(1.051,-1.975) L10(1.451,-1.975) L11(1.851,-1.975) L12(2.251,-1.975)
Top Overlay:
  circle w0.25: c-2.709,2.585 r0.125
Mechanical 13:
  lines w0.1: -2.499,-2.325 2.601,-2.325 2.601,2.375 -2.499,2.375 -2.499,-2.325
Mechanical 15:
  lines w0.05: -2.749,-2.575 2.851,-2.575 2.851,2.625 -2.749,2.625 -2.749,-2.575
  lines w0.1: -0.449,0.025 0.551,0.025 ; 0.051,-0.475 0.051,0.525
3D body: height 0.6, standoff 0.18, extent -2.499,-2.325 2.601,2.375
3D body: height 0.61, standoff 0.2, extent -2.23,1.655 -1.832,2.054

## BGA132_0.5(7X7) [mm]
pads (132):
  round 0.2 smd: A1(-2.75,2.839) A2(-2.25,2.839) A3(-1.75,2.839) A4(-1.25,2.839) A5(-0.75,2.839) A6(-0.25,2.839) A7(0.25,2.839) A8(0.75,2.839) A9(1.25,2.839) A10(1.75,2.839) A11(2.25,2.839) A12(2.75,2.839) B1(-2.75,2.339) B2(-2.25,2.339) B3(-1.75,2.339) B4(-1.25,2.339) B5(-0.75,2.339) B6(-0.25,2.339) B7(0.25,2.339) B8(0.75,2.339) B9(1.25,2.339) B10(1.75,2.339) B11(2.25,2.339) B12(2.75,2.339) C1(-2.75,1.839) C2(-2.25,1.839) C3(-1.75,1.839) C4(-1.25,1.839) C5(-0.75,1.839) C6(-0.25,1.839) C7(0.25,1.839) C8(0.75,1.839) C9(1.25,1.839) C10(1.75,1.839) C11(2.25,1.839) C12(2.75,1.839) D1(-2.75,1.339) D2(-2.25,1.339) D3(-1.75,1.339) D4(-1.25,1.339) D5(-0.75,1.339) D6(-0.25,1.339) D7(0.25,1.339) D8(0.75,1.339) D9(1.25,1.339) D10(1.75,1.339) D11(2.25,1.339) D12(2.75,1.339) E1(-2.75,0.839) E2(-2.25,0.839) E3(-1.75,0.839) E4(-1.25,0.839) E9(1.25,0.839) E10(1.75,0.839) E11(2.25,0.839) E12(2.75,0.839) F1(-2.75,0.339) F2(-2.25,0.339) F3(-1.75,0.339) F4(-1.25,0.339) F6(-0.25,0.339) F7(0.25,0.339) F9(1.25,0.339) F10(1.75,0.339) F11(2.25,0.339) F12(2.75,0.339) G1(-2.75,-0.161) G2(-2.25,-0.161) G3(-1.75,-0.161) G4(-1.25,-0.161) G6(-0.25,-0.161) G7(0.25,-0.161) G9(1.25,-0.161) G10(1.75,-0.161) G11(2.25,-0.161) G12(2.75,-0.161) H1(-2.75,-0.661) H2(-2.25,-0.661) H3(-1.75,-0.661) H4(-1.25,-0.661) H9(1.25,-0.661) H10(1.75,-0.661) H11(2.25,-0.661) H12(2.75,-0.661) J1(-2.75,-1.161) J2(-2.25,-1.161) J3(-1.75,-1.161) J4(-1.25,-1.161) J5(-0.75,-1.161) J6(-0.25,-1.161) J7(0.25,-1.161) J8(0.75,-1.161) J9(1.25,-1.161) J10(1.75,-1.161) J11(2.25,-1.161) J12(2.75,-1.161) K1(-2.75,-1.661) K2(-2.25,-1.661) K3(-1.75,-1.661) K4(-1.25,-1.661) K5(-0.75,-1.661) K6(-0.25,-1.661) K7(0.25,-1.661) K8(0.75,-1.661) K9(1.25,-1.661) K10(1.75,-1.661) K11(2.25,-1.661) K12(2.75,-1.661) L1(-2.75,-2.161) L2(-2.25,-2.161) L3(-1.75,-2.161) L4(-1.25,-2.161) L5(-0.75,-2.161) L6(-0.25,-2.161) L7(0.25,-2.161) L8(0.75,-2.161) L9(1.25,-2.161) L10(1.75,-2.161) L11(2.25,-2.161) L12(2.75,-2.161) M1(-2.75,-2.661) M2(-2.25,-2.661) M3(-1.75,-2.661) M4(-1.25,-2.661) M5(-0.75,-2.661) M6(-0.25,-2.661) M7(0.25,-2.661) M8(0.75,-2.661) M9(1.25,-2.661) M10(1.75,-2.661) M11(2.25,-2.661) M12(2.75,-2.661)
Top Overlay:
  circle w0.25: c-4.15,3.439 r0.125
  region: -2.707,3.589 -3.5,2.796 -3.5,3.589
  lines w0.2: -3.5,2.796 -2.707,3.589 ; -3.5,-3.411 3.5,-3.411 3.5,3.589 -3.5,3.589 -3.5,-3.411
Mechanical 13:
  lines w0.1: -3.5,-3.411 3.5,-3.411 3.5,3.589 -3.5,3.589 -3.5,-3.411
Mechanical 15:
  lines w0.05: -4,-3.911 4,-3.911 4,4.089 -4,4.089 -4,-3.911
  lines w0.1: -0.5,0.089 0.5,0.089 ; 0,-0.411 0,0.589
3D body: height 0.61, standoff 0.18, extent -3.043,2.722 -2.645,3.121
3D body: height 0.6, standoff 0.05, extent -3.5,-3.411 3.5,3.589

## BGA143_0.4(5.5X4.5) [mm]
pads (143):
  round 0.2 smd: A1(-2,2.4) A2(-1.6,2.4) A3(-1.2,2.4) A4(-0.8,2.4) A5(-0.4,2.4) A6(0,2.4) A7(0.4,2.4) A8(0.8,2.4) A9(1.2,2.4) A10(1.6,2.4) A11(2,2.4) B1(-2,2) B2(-1.6,2) B3(-1.2,2) B4(-0.8,2) B5(-0.4,2) B6(0,2) B7(0.4,2) B8(0.8,2) B9(1.2,2) B10(1.6,2) B11(2,2) C1(-2,1.6) C2(-1.6,1.6) C3(-1.2,1.6) C4(-0.8,1.6) C5(-0.4,1.6) C6(0,1.6) C7(0.4,1.6) C8(0.8,1.6) C9(1.2,1.6) C10(1.6,1.6) C11(2,1.6) D1(-2,1.2) D2(-1.6,1.2) D3(-1.2,1.2) D4(-0.8,1.2) D5(-0.4,1.2) D6(0,1.2) D7(0.4,1.2) D8(0.8,1.2) D9(1.2,1.2) D10(1.6,1.2) D11(2,1.2) E1(-2,0.8) E2(-1.6,0.8) E3(-1.2,0.8) E4(-0.8,0.8) E5(-0.4,0.8) E6(0,0.8) E7(0.4,0.8) E8(0.8,0.8) E9(1.2,0.8) E10(1.6,0.8) E11(2,0.8) F1(-2,0.4) F2(-1.6,0.4) F3(-1.2,0.4) F4(-0.8,0.4) F5(-0.4,0.4) F6(0,0.4) F7(0.4,0.4) F8(0.8,0.4) F9(1.2,0.4) F10(1.6,0.4) F11(2,0.4) G1(-2,0) G2(-1.6,0) G3(-1.2,0) G4(-0.8,0) G5(-0.4,0) G6(0,0) G7(0.4,0) G8(0.8,0) G9(1.2,0) G10(1.6,0) G11(2,0) H1(-2,-0.4) H2(-1.6,-0.4) H3(-1.2,-0.4) H4(-0.8,-0.4) H5(-0.4,-0.4) H6(0,-0.4) H7(0.4,-0.4) H8(0.8,-0.4) H9(1.2,-0.4) H10(1.6,-0.4) H11(2,-0.4) J1(-2,-0.8) J2(-1.6,-0.8) J3(-1.2,-0.8) J4(-0.8,-0.8) J5(-0.4,-0.8) J6(0,-0.8) J7(0.4,-0.8) J8(0.8,-0.8) J9(1.2,-0.8) J10(1.6,-0.8) J11(2,-0.8) K1(-2,-1.2) K2(-1.6,-1.2) K3(-1.2,-1.2) K4(-0.8,-1.2) K5(-0.4,-1.2) K6(0,-1.2) K7(0.4,-1.2) K8(0.8,-1.2) K9(1.2,-1.2) K10(1.6,-1.2) K11(2,-1.2) L1(-2,-1.6) L2(-1.6,-1.6) L3(-1.2,-1.6) L4(-0.8,-1.6) L5(-0.4,-1.6) L6(0,-1.6) L7(0.4,-1.6) L8(0.8,-1.6) L9(1.2,-1.6) L10(1.6,-1.6) L11(2,-1.6) M1(-2,-2) M2(-1.6,-2) M3(-1.2,-2) M4(-0.8,-2) M5(-0.4,-2) M6(0,-2) M7(0.4,-2) M8(0.8,-2) M9(1.2,-2) M10(1.6,-2) M11(2,-2) N1(-2,-2.4) N2(-1.6,-2.4) N3(-1.2,-2.4) N4(-0.8,-2.4) N5(-0.4,-2.4) N6(0,-2.4) N7(0.4,-2.4) N8(0.8,-2.4) N9(1.2,-2.4) N10(1.6,-2.4) N11(2,-2.4)
Top Overlay:
  circle w0.25: c-2.47,2.985 r0.125
Mechanical 13:
  lines w0.1: -2.26,-2.775 2.26,-2.775 2.26,2.775 -2.26,2.775 -2.26,-2.775
Mechanical 15:
  lines w0.05: -2.775,-3.275 2.775,-3.275 2.775,3.275 -2.775,3.275 -2.775,-3.275
  lines w0.1: -0.5,0 0.5,0 ; 0,-0.5 0,0.5
3D body "BGA143C40P11X13_450X550X65.step": height 0.65, standoff 0, extent -2.25,-2.75 2.25,2.75

## BGA144_0.8(10X10) [mm]
pads (144):
  round 0.38 smd: A1(-4.375,4.375) A2(-3.575,4.375) A3(-2.775,4.375) A4(-1.975,4.375) A5(-1.175,4.375) A6(-0.375,4.375) A7(0.425,4.375) A8(1.225,4.375) A9(2.025,4.375) A10(2.825,4.375) A11(3.625,4.375) A12(4.425,4.375) B1(-4.375,3.575) B2(-3.575,3.575) B3(-2.775,3.575) B4(-1.975,3.575) B5(-1.175,3.575) B6(-0.375,3.575) B7(0.425,3.575) B8(1.225,3.575) B9(2.025,3.575) B10(2.825,3.575) B11(3.625,3.575) B12(4.425,3.575) C1(-4.375,2.775) C2(-3.575,2.775) C3(-2.775,2.775) C4(-1.975,2.775) C5(-1.175,2.775) C6(-0.375,2.775) C7(0.425,2.775) C8(1.225,2.775) C9(2.025,2.775) C10(2.825,2.775) C11(3.625,2.775) C12(4.425,2.775) D1(-4.375,1.975) D2(-3.575,1.975) D3(-2.775,1.975) D4(-1.975,1.975) D5(-1.175,1.975) D6(-0.375,1.975) D7(0.425,1.975) D8(1.225,1.975) D9(2.025,1.975) D10(2.825,1.975) D11(3.625,1.975) D12(4.425,1.975) E1(-4.375,1.175) E2(-3.575,1.175) E3(-2.775,1.175) E4(-1.975,1.175) E5(-1.175,1.175) E6(-0.375,1.175) E7(0.425,1.175) E8(1.225,1.175) E9(2.025,1.175) E10(2.825,1.175) E11(3.625,1.175) E12(4.425,1.175) F1(-4.375,0.375) F2(-3.575,0.375) F3(-2.775,0.375) F4(-1.975,0.375) F5(-1.175,0.375) F6(-0.375,0.375) F7(0.425,0.375) F8(1.225,0.375) F9(2.025,0.375) F10(2.825,0.375) F11(3.625,0.375) F12(4.425,0.375) G1(-4.375,-0.425) G2(-3.575,-0.425) G3(-2.775,-0.425) G4(-1.975,-0.425) G5(-1.175,-0.425) G6(-0.375,-0.425) G7(0.425,-0.425) G8(1.225,-0.425) G9(2.025,-0.425) G10(2.825,-0.425) G11(3.625,-0.425) G12(4.425,-0.425) H1(-4.375,-1.225) H2(-3.575,-1.225) H3(-2.775,-1.225) H4(-1.975,-1.225) H5(-1.175,-1.225) H6(-0.375,-1.225) H7(0.425,-1.225) H8(1.225,-1.225) H9(2.025,-1.225) H10(2.825,-1.225) H11(3.625,-1.225) H12(4.425,-1.225) J1(-4.375,-2.025) J2(-3.575,-2.025) J3(-2.775,-2.025) J4(-1.975,-2.025) J5(-1.175,-2.025) J6(-0.375,-2.025) J7(0.425,-2.025) J8(1.225,-2.025) J9(2.025,-2.025) J10(2.825,-2.025) J11(3.625,-2.025) J12(4.425,-2.025) K1(-4.375,-2.825) K2(-3.575,-2.825) K3(-2.775,-2.825) K4(-1.975,-2.825) K5(-1.175,-2.825) K6(-0.375,-2.825) K7(0.425,-2.825) K8(1.225,-2.825) K9(2.025,-2.825) K10(2.825,-2.825) K11(3.625,-2.825) K12(4.425,-2.825) L1(-4.375,-3.625) L2(-3.575,-3.625) L3(-2.775,-3.625) L4(-1.975,-3.625) L5(-1.175,-3.625) L6(-0.375,-3.625) L7(0.425,-3.625) L8(1.225,-3.625) L9(2.025,-3.625) L10(2.825,-3.625) L11(3.625,-3.625) L12(4.425,-3.625) M1(-4.375,-4.425) M2(-3.575,-4.425) M3(-2.775,-4.425) M4(-1.975,-4.425) M5(-1.175,-4.425) M6(-0.375,-4.425) M7(0.425,-4.425) M8(1.225,-4.425) M9(2.025,-4.425) M10(2.825,-4.425) M11(3.625,-4.425) M12(4.425,-4.425)
Top Overlay:
  circle w0.25: c-5.625,4.825 r0.125
  region: -4.658,4.975 -4.975,4.658 -4.975,4.975
  lines w0.2: -4.975,4.658 -4.658,4.975 ; -4.975,-5.025 -4.975,4.975 5.025,4.975 5.025,-5.025 -4.975,-5.025
Mechanical 13:
  lines w0.1: -4.975,-5.025 -4.975,4.975 5.025,4.975 5.025,-5.025 -4.975,-5.025
Mechanical 15:
  lines w0.05: -5.475,-5.525 -5.475,5.475 5.525,5.475 5.525,-5.525 -5.475,-5.525
  lines w0.1: -0.475,-0.025 0.525,-0.025 ; 0.025,-0.525 0.025,0.475
3D body "User Library-BGA 144.step": height 1.3, standoff 0.05, extent -4.974,-5.026 5.026,4.974
3D body: height 1.4, standoff 0.4, extent -4.535,3.413 -3.538,4.411